# Altium footprint library AltiumLibraries.PcbLib: 247 footprints (part 13 of 16)
Each footprint in its own frame and in the unit in brackets; x right, y up, seen from the top. Pads: shape width x height; smd on the part's side, far side on the other; paste and mask are expansions set on the pad; w line width, h text height; cw(c..) or ccw(c..) is an arc to the next point about the centre after c.
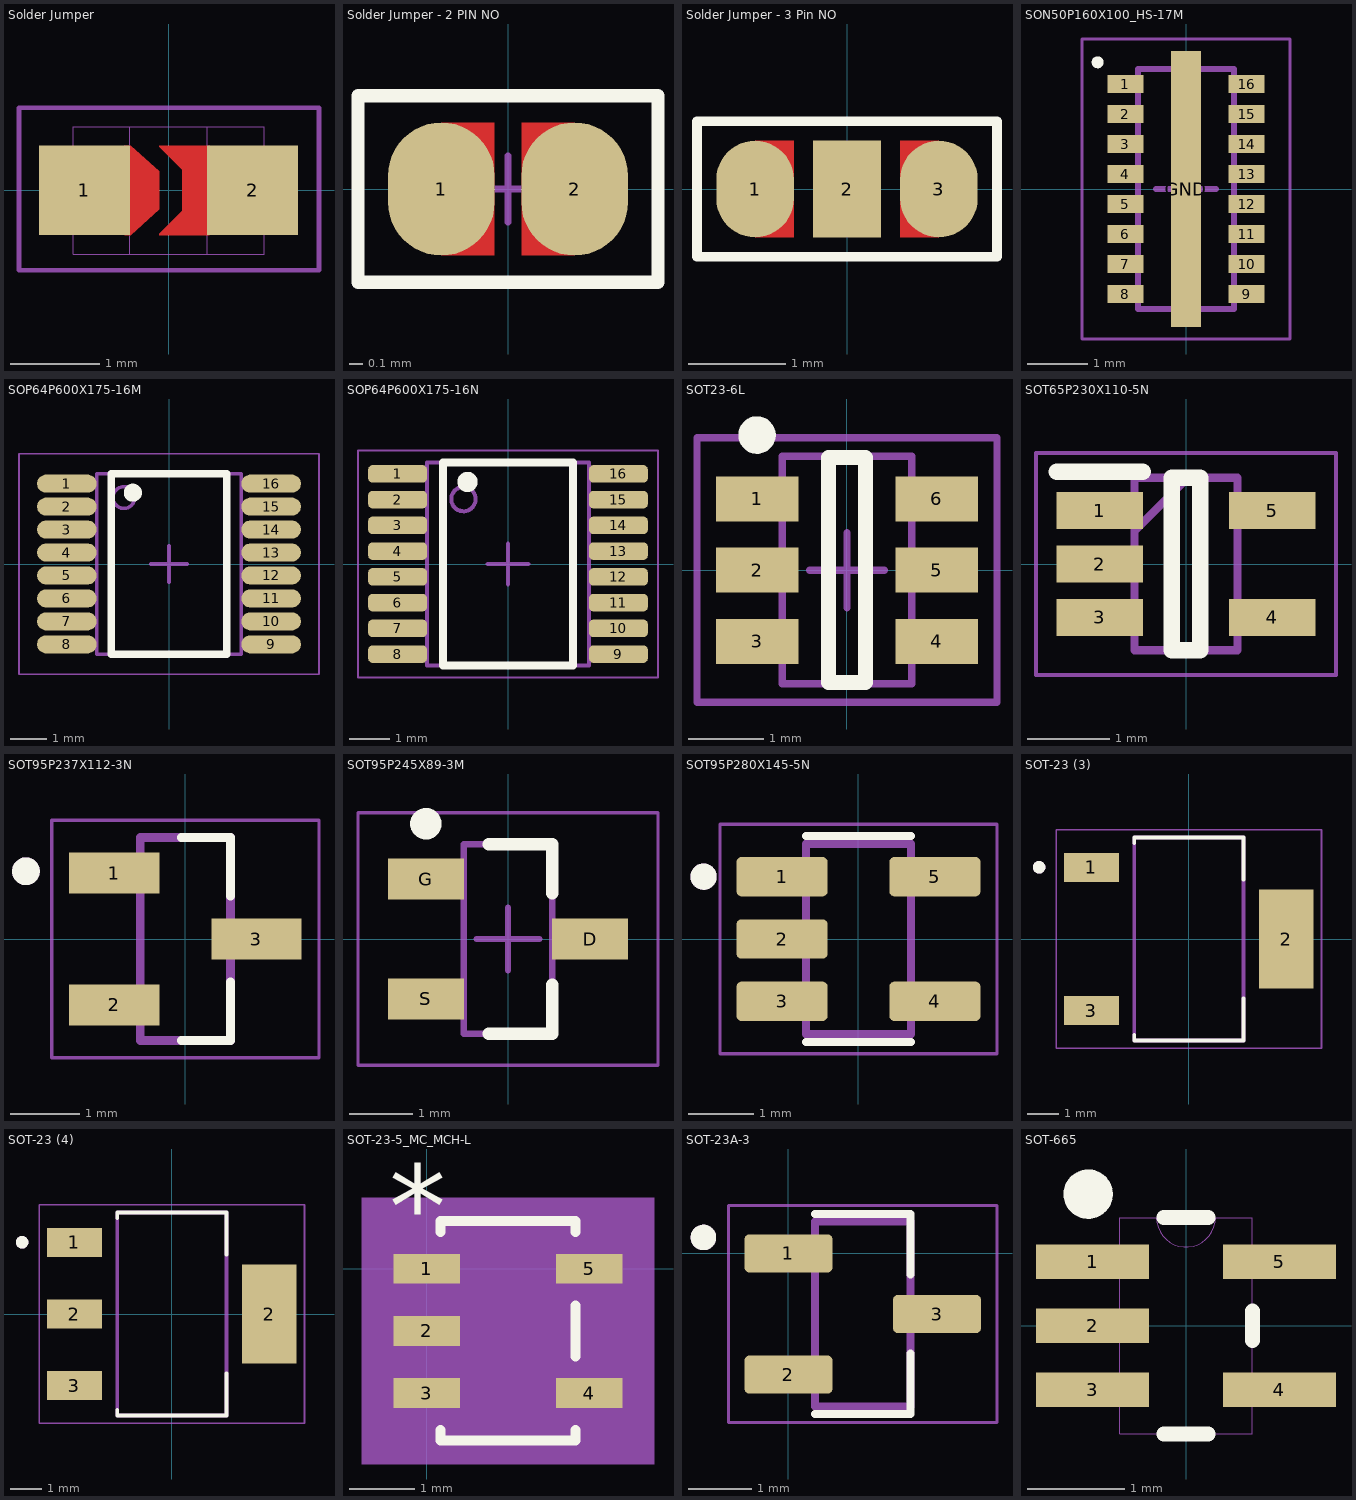
[diagram p12: the footprints below, top view; thin cyan lines are the x and y axes]

## Solder Jumper [mil] "Solder jumper 2 pin compatible with 0805 passives"
pads (2):
  rect 40x39.37 smd: 1(-37,0) 2(37,0)
Top Layer:
  region: 18,19.68 -4.06,19.68 -4.06,19.06 6,9 6,-15.35 18,-15.35
  region: 18,-19.68 -4.06,-19.68 -4.06,-19.06 6,-9 6,15.35 18,15.35
  region: -16.54,19.68 -4.01,8.37 -3.99,-8.37 -16.54,-19.68 -19.29,-19.68 -19.29,19.68
Mechanical 1:
  lines w0: -17,-28 -17,28 ; -17,-28 -42,-28 -42,28 -17,28 ; -17,-28 17,-28 ; -17,28 17,28 ; 17,-28 17,28 ; 17,-28 42,-28 42,28 17,28
Mechanical 15:
  lines w2.01: -65.75,-35.04 -65.75,36.22 66.14,36.22 66.14,-35.04 -65.75,-35.04

## Solder Jumper - 2 PIN NO [mm] "Solder jumper 2 pin"
pads (2):
  oval 0.8x1 smd: 1(-0.5,0) 2(0.5,0)
Top Layer:
  rectangle: -0.5,-0.5 -0.1,0.5
  region: 0.5,0.5 0.1,0.5 0.1,-0.5 0.5,-0.5
Top Overlay:
  lines w0.1: -1.125,-0.7 1.125,-0.7 1.125,0.7 -1.125,0.7 -1.125,-0.7
Mechanical 15:
  lines w0.05: -0.225,0 0.025,0 ; -0.025,0 0.225,0 ; 0,-0.25 0,0 0,0.25 ; -1.125,-0.7 1.125,-0.7 1.125,0.7 -1.125,0.7 -1.125,-0.7

## Solder Jumper - 3 Pin NO [mm] "Solder jumper, Normally Open"
pads (3):
  oval 0.8x1 smd: 1(-0.95,0) 3(0.95,0)
  rect 0.7x1 smd: 2(0,0)
Top Layer:
  region: 0.95,0.5 0.55,0.5 0.55,-0.5 0.95,-0.5
  rectangle: -0.95,-0.5 -0.55,0.5
Top Overlay:
  lines w0.1: -1.55,-0.7 -1.55,0.7 1.55,0.7 1.55,-0.7 -1.55,-0.7
Mechanical 15:
  lines w0.05: -0.25,0 0,0 ; 0,-0.25 0,0 ; 0,0.25 0,0 ; 0.25,0 0,0 ; -1.55,-0.7 -1.55,0.7 1.55,0.7 1.55,-0.7 -1.55,-0.7

## SON50P160X100_HS-17M [mm] "SON, 16-Leads, Body 4.00x1.60mm, Pitch 0.50mm, Thermal Pad 4.10x0.50mm, IPC Low Density"
height 1
pads (17):
  rect 0.6x0.3 smd: 1(-1.01,1.75) 2(-1.01,1.25) 3(-1.01,0.75) 4(-1.01,0.25) 5(-1.01,-0.25) 6(-1.01,-0.75) 7(-1.01,-1.25) 8(-1.01,-1.75) 9(1.01,-1.75) 10(1.01,-1.25) 11(1.01,-0.75) 12(1.01,-0.25) 13(1.01,0.25) 14(1.01,0.75) 15(1.01,1.25) 16(1.01,1.75)
  rect 0.5x4.6 smd: GND(0,0)
Top Overlay:
  circle w0.1: c-1.472,2.112 r0.05
Mechanical 13:
  lines w0.1: -0.8,-2 -0.8,2 0.8,2 0.8,-2 -0.8,-2
Mechanical 15:
  lines w0.05: -1.735,-2.5 -1.735,2.5 1.735,2.5 1.735,-2.5 -1.735,-2.5
  lines w0.1: -0.5,0 0.5,0 ; 0,-0.5 0,0.5
3D body: height 1, standoff 0, extent -0.8,-2 0.8,2

## SOP64P600X175-16M [mm] "SOP, 16-Leads, Body 4.90x3.91mm, Pitch 0.64mm, IPC Low Density"
height 1.76
pads (16):
  oval 1.65x0.5 smd: 1(-2.825,2.222) 2(-2.825,1.587) 3(-2.825,0.953) 4(-2.825,0.318) 5(-2.825,-0.318) 6(-2.825,-0.953) 7(-2.825,-1.587) 8(-2.825,-2.222) 9(2.825,-2.222) 10(2.825,-1.587) 11(2.825,-0.953) 12(2.825,-0.318) 13(2.825,0.318) 14(2.825,0.953) 15(2.825,1.587) 16(2.825,2.222)
Top Overlay:
  circle w0.25: c-1,1.973 r0.125
  lines w0.2: -1.6,-2.5 1.6,-2.5 1.6,2.5 -1.6,2.5 -1.6,-2.5
Mechanical 1:
  circle w0.1: c-1.25,1.837 r0.3
  lines w0.1: -2,-2.5 -2,2.5 2,2.5 2,-2.5 -2,-2.5
Mechanical 15:
  lines w0.05: -4.15,-3.05 4.15,-3.05 4.15,3.05 -4.15,3.05 -4.15,-3.05
  lines w0.1: -0.5,0 0.5,0 ; 0,-0.5 0,0.5
3D body "SOP64P600X175-16M.step": height 1.75, standoff 0, extent -2.997,-2.5 2.997,2.5

## SOP64P600X175-16N [mm] "SOP, 16-Leads, Body 4.90x3.91mm, Pitch 0.64mm, IPC Medium Density"
height 1.76
pads (16):
  rrect50% 1.45x0.435 smd mask+0.05: 1(-2.725,2.222) 2(-2.725,1.587) 3(-2.725,0.953) 4(-2.725,0.318) 5(-2.725,-0.318) 6(-2.725,-0.953) 7(-2.725,-1.587) 8(-2.725,-2.222) 9(2.725,-2.222) 10(2.725,-1.587) 11(2.725,-0.953) 12(2.725,-0.318) 13(2.725,0.318) 14(2.725,0.953) 15(2.725,1.587) 16(2.725,2.222)
Top Overlay:
  circle w0.25: c-1,2.025 r0.125
  lines w0.2: -1.6,-2.5 1.6,-2.5 1.6,2.5 -1.6,2.5 -1.6,-2.5
Mechanical 13:
  circle w0.1: c-1.1,1.6 r0.3
  lines w0.1: -2,-2.5 -2,2.5 2,2.5 2,-2.5 -2,-2.5
Mechanical 15:
  lines w0.05: -3.7,-2.8 3.7,-2.8 3.7,2.8 -3.7,2.8 -3.7,-2.8
  lines w0.1: -0.5,0 0.5,0 ; 0,-0.5 0,0.5
3D body: height 1.76, standoff 0.1, extent -2,-2.5 2,2.5

## SOT23-6L [mm]
height 1.25
pads (6):
  rect 1.1x0.6 smd: 1(-1.2,0.95) 2(-1.2,0) 3(-1.2,-0.95) 4(1.2,-0.95) 5(1.2,0) 6(1.2,0.95)
Top Overlay:
  circle w0.25: c-1.2,1.8 r0.125
  lines w0.2: -0.25,-1.5 -0.25,1.5 0.25,1.5 0.25,-1.5 -0.25,-1.5
Mechanical 13:
  lines w0.1: -0.865,-1.515 0.865,-1.515 0.865,1.515 -0.865,1.515 -0.865,-1.515
Mechanical 15:
  lines w0.1: -0.5,0 0.5,0 ; 0,-0.5 0,0.5 ; -2,-1.763 2,-1.763 2,1.763 -2,1.763 -2,-1.763
3D body: height 1.25, standoff 0.05, extent -0.865,-1.515 0.865,1.515

## SOT65P230X110-5N [mm]
pads (5):
  rect 1.05x0.45 smd: 1(-1.05,0.65) 2(-1.05,0) 3(-1.05,-0.65) 4(1.05,-0.65) 5(1.05,0.65)
Top Overlay:
  lines w0.2: -1.575,1.125 -0.525,1.125 ; -0.175,-1.05 0.175,-1.05 0.175,1.05 -0.175,1.05 -0.175,-1.05
Mechanical 13:
  lines w0.1: -0.625,0.4 0.025,1.05 ; -0.625,-1.05 0.625,-1.05 0.625,1.05 -0.625,1.05 -0.625,-1.05
Mechanical 15:
  lines w0.05: -1.825,-1.35 1.825,-1.35 1.825,1.35 -1.825,1.35 -1.825,-1.35
3D body "CPDV5-3V3UP.stp": height 1.1, standoff 0, extent -1.15,-1.05 1.15,1.05

## SOT95P237X112-3N [mm]
pads (3):
  rect 1.3x0.59 smd: 1(-1.025,0.95) 2(-1.025,-0.95) 3(1.025,0)
Top Overlay:
  circle w0.2: c-2.295,0.975 r0.1
  lines w0.127: -0.055,-1.46 0.65,-1.46 0.65,-0.615 ; -0.055,1.46 0.65,1.46 0.65,0.615
Mechanical 13:
  circle w0.2: c-2.295,0.975 r0.1
  lines w0.127: -0.65,-1.46 0.65,-1.46 0.65,1.46 -0.65,1.46 -0.65,-1.46
Mechanical 15:
  lines w0.05: -1.925,-1.71 -1.925,1.71 1.925,1.71 1.925,-1.71 -1.925,-1.71
3D body "SOT23-3.stp": height 1.2, standoff 0.02, extent -1.545,-1.5 1.291,1.5

## SOT95P245X89-3M [mm] "SOT23, 3-Leads, Body 2.90x2.45mm, Pitch 0.95mm, IPC Low Density"
height 0.89
pads (3):
  rect 1.2x0.65 smd: D(1.3,0) G(-1.3,0.95) S(-1.3,-0.95)
Top Overlay:
  circle w0.25: c-1.3,1.825 r0.125
  lines w0.2: -0.3,-1.5 0.7,-1.5 0.7,-0.725 ; -0.3,1.5 0.7,1.5 0.7,0.725
Mechanical 13:
  lines w0.1: -0.7,-1.5 -0.7,1.5 0.7,1.5 0.7,-1.5 -0.7,-1.5
Mechanical 15:
  lines w0.05: -2.375,-2 -2.375,2 2.375,2 2.375,-2 -2.375,-2
  lines w0.1: -0.5,0 0.5,0 ; 0,-0.5 0,0.5
3D body: height 0.89, standoff 0.01, extent -0.7,-1.5 0.7,1.5

## SOT95P280X145-5N [mm]
pads (5):
  rrect25% 1.39x0.6 smd: 1(-1.165,0.95) 2(-1.165,0) 3(-1.165,-0.95) 4(1.165,-0.95) 5(1.165,0.95)
Top Overlay:
  circle w0.2: c-2.36,0.95 r0.1
  lines w0.127: -0.8,-1.57 0.8,-1.57 ; -0.8,1.57 0.8,1.57
Mechanical 13:
  circle w0.2: c-2.36,0.95 r0.1
  lines w0.127: -0.8,-1.45 0.8,-1.45 0.8,1.45 -0.8,1.45 -0.8,-1.45
Mechanical 15:
  lines w0.05: -2.11,-1.75 2.11,-1.75 2.11,1.75 -2.11,1.75 -2.11,-1.75
3D body "RJ_5_ADI.step": height 1.45, standoff 0, extent -1.499,-1.499 1.499,1.499

## SOT-23 (3) [mm]
pads (3):
  rect 1.76x0.93 smd: 1(-3.125,2.3) 3(-3.125,-2.3)
  rect 1.76x3.19 smd: 2(3.125,0)
Top Overlay:
  circle w0.2: c-4.8,2.3 r0.1
  lines w0.127: -1.75,-3.08 -1.75,-3.25 1.75,-3.25 1.75,-1.91 ; -1.75,3.08 -1.75,3.25 1.75,3.25 1.75,1.91
Mechanical 4:
  circle w0.2: c-4.8,2.3 r0.1
  circle w0.2: c-4.8,2.3 r0.1
  lines w0.127: -1.75,-3.25 1.75,-3.25 ; -1.75,-3.25 -1.75,3.25 ; -1.75,-3.25 1.75,-3.25 ; -1.75,-3.25 -1.75,3.25 ; -1.75,3.25 1.75,3.25 ; -1.75,3.25 1.75,3.25 ; 1.75,-3.25 1.75,3.25 ; 1.75,-3.25 1.75,3.25
Mechanical 16:
  lines w0.05: -4.255,-3.5 4.255,-3.5 4.255,3.5 -4.255,3.5 -4.255,-3.5

## SOT-23 (4) [mm]
pads (4):
  rect 1.76x0.93 smd: 1(-3.125,2.3) 2(-3.125,0) 3(-3.125,-2.3)
  rect 1.76x3.19 smd: 2(3.125,0)
Top Overlay:
  circle w0.2: c-4.8,2.3 r0.1
  lines w0.127: -1.75,-3.08 -1.75,-3.25 1.75,-3.25 1.75,-1.91 ; -1.75,3.08 -1.75,3.25 1.75,3.25 1.75,1.91
Mechanical 4:
  circle w0.2: c-4.8,2.3 r0.1
  circle w0.2: c-4.8,2.3 r0.1
  lines w0.127: -1.75,-3.25 1.75,-3.25 ; -1.75,-3.25 -1.75,3.25 ; -1.75,-3.25 1.75,-3.25 ; -1.75,-3.25 -1.75,3.25 ; -1.75,3.25 1.75,3.25 ; -1.75,3.25 1.75,3.25 ; 1.75,-3.25 1.75,3.25 ; 1.75,-3.25 1.75,3.25
Mechanical 16:
  lines w0.05: -4.255,-3.5 4.255,-3.5 4.255,3.5 -4.255,3.5 -4.255,-3.5

## SOT-23-5_MC_MCH-L [mil]
pads (5):
  rect 40x18 smd paste+0 mask+0: 1(0,0) 2(0,-37.4) 3(0,-74.8) 4(98,-74.8) 5(98,0)
Top Overlay:
  lines w6: 8.5,-96.9 8.5,-103.4 89.5,-103.4 89.5,-96.9 ; 8.5,22.1 8.5,28.6 89.5,28.6 89.5,22.1 ; 89.5,-52.7 89.5,-22.1
  text "*" at -22.5,13 h50
Mechanical 5:
  region: 137,-117.4 -39,-117.4 -39,42.6 137,42.6
Mechanical 13:
  lines w0: 37,23.6 ccw(c49,23.6) 61,23.6
  lines w1: -14,-84.8 13.5,-84.8 13.5,-64.8 -14,-64.8 -14,-84.8 ; -14,-47.4 13.5,-47.4 13.5,-27.4 -14,-27.4 -14,-47.4 ; -14,-10 13.5,-10 13.5,10 -14,10 -14,-10 ; 13.5,-98.4 13.5,23.6 84.5,23.6 84.5,-98.4 13.5,-98.4 ; 84.5,-84.8 112,-84.8 112,-64.8 84.5,-64.8 84.5,-84.8 ; 84.5,-10 112,-10 112,10 84.5,10 84.5,-10
  text "*" at 11,-25 h50
Mechanical 15:
  region: 88.5,-102.4 9.5,-102.4 9.5,-87.8 -24,-87.8 -24,13 9.5,13 9.5,27.6 88.5,27.6 88.5,13 122,13 122,-87.8 88.5,-87.8
  lines w6: -24,-87.8 -24,13 9.5,13 9.5,27.6 88.5,27.6 88.5,13 122,13 122,-87.8 88.5,-87.8 88.5,-102.4 9.5,-102.4 9.5,-87.8 -24,-87.8
3D body "SOT-23-5_MC_MCH.step": height 57.09, standoff 0, extent -13.99,-98.39 111.99,23.58

## SOT-23A-3 [mm]
pads (3):
  rrect25% 1.38x0.6 smd: 1(0,0) 2(0,-1.9) 3(2.33,-0.95)
Top Overlay:
  circle w0.2: c-1.335,0.25 r0.1
  lines w0.127: 0.415,-2.52 1.915,-2.52 1.915,-1.57 ; 0.415,0.62 1.915,0.62 1.915,-0.33
Mechanical 13:
  circle w0.2: c-1.335,0.25 r0.1
  lines w0.127: 0.415,-2.4 1.915,-2.4 1.915,0.5 0.415,0.5 0.415,-2.4
Mechanical 15:
  lines w0.05: -0.94,-2.65 -0.94,0.75 3.27,0.75 3.27,-2.65 -0.94,-2.65
3D body "SOT23-3.stp": height 1.2, standoff 0.02, extent -0.243,-2.45 2.593,0.55

## SOT-665 [mil]
pads (5):
  rect 46x14 smd: 1(-38,26) 2(-38,0) 3(-38,-26) 4(38,-26) 5(38,26)
Top Overlay:
  circle w10: c-39.76,53.54 r5.04
  lines w6: -9,-44 9,-44 ; -9,44 9,44 ; 27,-6 27,6
Mechanical 4:
  lines w0: -44,-31 -44,-20 ; -44,-31 -27,-31 ; -44,-31 -44,-20 ; -44,-31 -27,-31 ; -44,-20 -27,-20 ; -44,-20 -27,-20 ; -44,-6 -44,6 ; -44,-6 -27,-6 ; -44,-6 -44,6 ; -44,-6 -27,-6 ; -44,6 -27,6 ; -44,6 -27,6 ; -44,20 -44,31 ; -44,20 -27,20 ; -44,20 -44,31 ; -44,20 -27,20 ; -44,31 -27,31 ; -44,31 -27,31 ; -27,-44 27,-44 ; -27,-44 -27,-31 ; -27,-44 27,-44 ; -27,-44 -27,-31 ; -27,-31 -27,-20 ; -27,-31 -27,-20 ; -27,-20 -27,-6 ; -27,-20 -27,-6 ; -27,-6 -27,6 ; -27,-6 -27,6 ; -27,6 -27,20 ; -27,6 -27,20 ; -27,20 -27,31 ; -27,20 -27,31 ; -27,31 -27,44 ; -27,31 -27,44 ; -27,44 -12,44 ; -27,44 -12,44 ; -12,44 ccw(c0,44) 12,44 ; -12,44 ccw(c0,44) 12,44 ; -12,44 12,44 ; -12,44 12,44 ; 12,44 27,44 ; 12,44 27,44 ; 27,-44 27,-31 ; 27,-44 27,-31 ; 27,-31 27,-20 ; 27,-31 44,-31 ; 27,-31 27,-20 ; 27,-31 44,-31 ; 27,-20 27,20 ; 27,-20 44,-20 ; 27,-20 27,20 ; 27,-20 44,-20 ; 27,20 27,31 ; 27,20 44,20 ; 27,20 27,31 ; 27,20 44,20 ; 27,31 27,44 ; 27,31 44,31 ; 27,31 27,44 ; 27,31 44,31 ; 44,-31 44,-20 ; 44,-31 44,-20 ; 44,20 44,31 ; 44,20 44,31